# Altium footprint library Supernova Connectors.PcbLib: 303 footprints (part 12 of 19)
Each footprint in its own frame and in the unit in brackets; x right, y up, seen from the top. Pads: shape width x height; smd on the part's side, far side on the other; paste and mask are expansions set on the pad; w line width, h text height; cw(c..) or ccw(c..) is an arc to the next point about the centre after c.
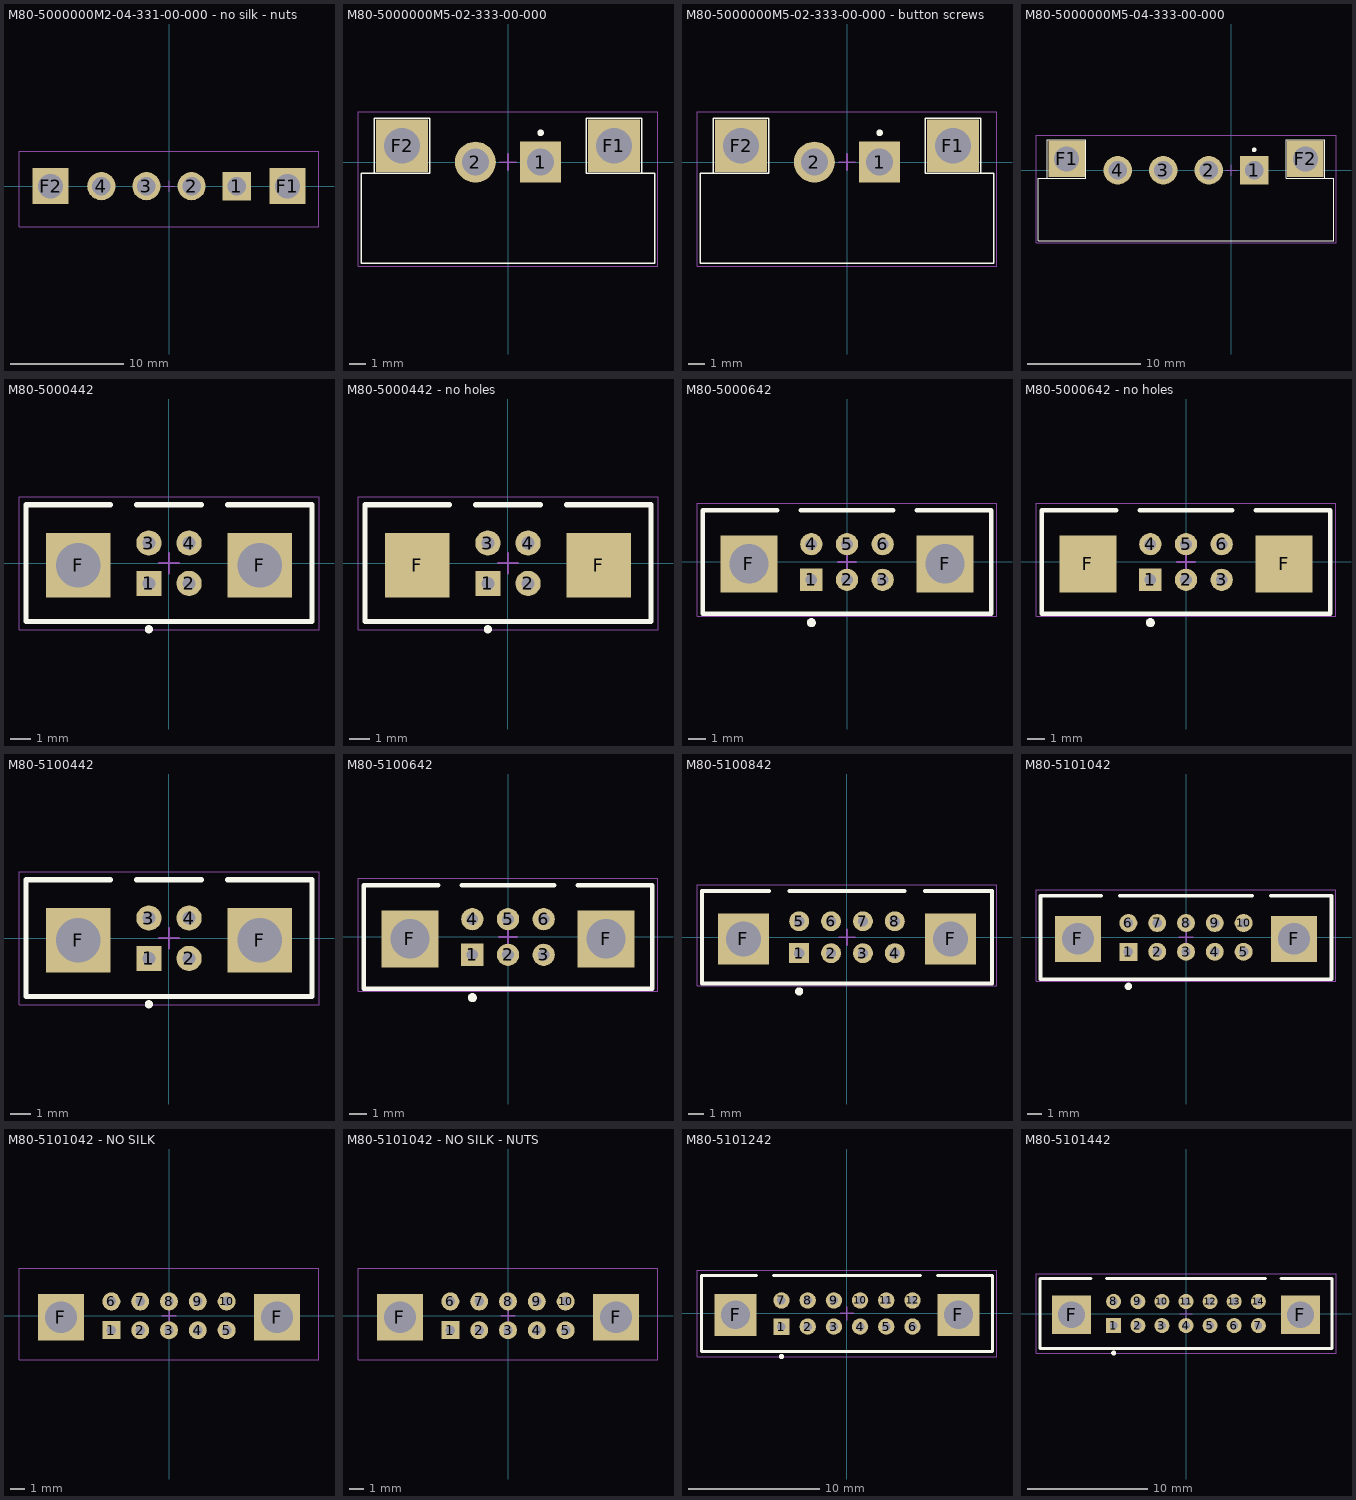
[diagram p11: the footprints below, top view; thin cyan lines are the x and y axes]

## M80-5000000M2-04-331-00-000 - no silk - nuts [mm]
pads (6):
  rect 2.5x2.5 hole 1.65: 1(6,0)
  round 2.5 hole 1.65: 2(2,0) 3(-2,0) 4(-6,0)
  rect 3.2x3.2 / inner round 4 / far side round 5 hole 2.2 paste+0 mask+0: F1(10.5,0) F2(-10.5,0)
Top Courtyard:
  lines w0.05: -13.3,-3.6 -13.3,3.1 13.3,3.1 13.3,-3.6 -13.3,-3.6
  lines w0.1: -0.5,0 0.5,0 ; 0,-0.5 0,0.5
3D body "m80-5000000m2-04-331-00-000_asm.STEP": height 6.29, standoff -2.81, extent -13,-3.275 13,2.775
3D body "94150A305_316 Stainless Steel Hex Nut.STEP": height 1.6, standoff 0, extent 8.5,-2.309 12.5,2.309
3D body "94150A305_316 Stainless Steel Hex Nut.STEP": height 1.6, standoff 0, extent -12.5,-2.309 -8.5,2.309

## M80-5000000M5-02-333-00-000 [mm]
pads (4):
  rect 2.5x2.5 hole 1.65: 1(2,0)
  round 2.5 hole 1.65: 2(-2,0)
  rect 3.2x3.2 / inner round 4 / far side round 4 hole 2.2 paste+0 mask+0: F1(6.5,1) F2(-6.5,1)
Top Overlay:
  circle w0.203: c2,1.795 r0.102
  lines w0.1: -8.207,-0.691 -8.207,2.687 -8.028,2.687 -4.803,2.687 -4.803,-0.691 -5.032,-0.691 -7.937,-0.691 -8.991,-0.691 -8.991,-6.2 8.991,-6.2 8.991,-0.691 7.937,-0.691 5.032,-0.691 4.803,-0.691 4.803,2.687 8.028,2.687 8.207,2.687 8.207,-0.691
Top Courtyard:
  lines w0.05: -9.2,-6.4 9.2,-6.4 9.2,3.1 -9.2,3.1 -9.2,-6.4
  lines w0.1: -0.5,0 0.5,0 ; 0,-0.5 0,0.5
3D body "m80-5000000m5-02-333-00-000_asm.stp": height 6.08, standoff -4.67, extent -9,-6.15 9,2.95

## M80-5000000M5-02-333-00-000 - button screws [mm]
pads (4):
  rect 2.5x2.5 hole 1.65: 1(2,0)
  round 2.5 hole 1.65: 2(-2,0)
  rect 3.2x3.2 / inner round 4 / far side round 4.5 hole 2.2 paste+0 mask+0: F1(6.5,1) F2(-6.5,1)
Top Overlay:
  circle w0.203: c2,1.795 r0.102
  lines w0.1: -8.207,-0.691 -8.207,2.687 -8.028,2.687 -4.803,2.687 -4.803,-0.691 -5.032,-0.691 -7.937,-0.691 -8.991,-0.691 -8.991,-6.2 8.991,-6.2 8.991,-0.691 7.937,-0.691 5.032,-0.691 4.803,-0.691 4.803,2.687 8.028,2.687 8.207,2.687 8.207,-0.691
Top Courtyard:
  lines w0.05: -9.2,-6.4 -9.2,3.1 9.2,3.1 9.2,-6.4 -9.2,-6.4
  lines w0.1: -0.5,0 0.5,0 ; 0,-0.5 0,0.5
3D body "m80-5000000m5-02-333-00-000_asm.stp.STEP": height 6.08, standoff -3.2, extent -9,-6.15 9,2.45
3D body "Screw, M2 Button.STEP": height 1.3, standoff -4, extent -8.5,-1 -4.5,3
3D body "Screw, M2 Button.STEP": height 1.3, standoff -4, extent 4.5,-1 8.5,3

## M80-5000000M5-04-333-00-000 [mm]
pads (6):
  rect 2.5x2.5 hole 1.65: 1(2,0)
  round 2.5 hole 1.65: 2(-2,0) 3(-6,0) 4(-10,0)
  rect 3.2x3.2 / inner round 4 / far side round 4 hole 2.2 paste+0 mask+0: F1(-14.5,1) F2(6.5,1)
Top Overlay:
  circle w0.203: c2,1.795 r0.102
  lines w0.1: -16.207,-0.691 -16.207,2.687 -16.028,2.687 -12.803,2.687 -12.803,-0.691 -13.032,-0.691 -15.937,-0.691 -16.991,-0.691 -16.991,-6.2 8.991,-6.2 8.991,-0.691 7.937,-0.691 5.032,-0.691 4.803,-0.691 4.803,2.687 8.028,2.687 8.207,2.687 8.207,-0.691
Top Courtyard:
  lines w0.05: -17.2,-6.4 9.2,-6.4 9.2,3.1 -17.2,3.1 -17.2,-6.4
  lines w0.1: -0.5,0 0.5,0 ; 0,-0.5 0,0.5
3D body "m80-5000000m5-04-333-00-000_asm.stp": height 6.08, standoff -3.45, extent -17,-6.15 9,2.95

## M80-5000442 [mm]
pads (6):
  rect 1.25x1.25 hole 0.65 paste+0: 1(-1,-1)
  round 1.25 hole 0.65 paste+0: 2(1,-1) 3(-1,1) 4(1,1)
  rect 3.2x3.2 / inner round 4 / far side round 4 hole 2.2 paste+0 mask+0: F(-4.5,-0.1) F(4.5,-0.1)
Top Overlay:
  circle w0.203: c-1,-3.278 r0.102
  lines w0.254: -2.9,2.9 -7.1,2.9 -7.1,-2.9 7.1,-2.9 7.1,2.9 2.9,2.9 ; -1.6,2.9 1.6,2.9
Top Courtyard:
  lines w0.05: -7.446,-3.302 7.446,-3.302 7.446,3.302 -7.446,3.302 -7.446,-3.302
  lines w0.1: -0.5,0 0.5,0 ; 0,-0.5 0,0.5
3D body "m80-5000442_asm.stp": height 5.65, standoff -3.2, extent -7,-2.775 7,3.275

## M80-5000442 - no holes [mm]
pads (6):
  rect 1.25x1.25 hole 0.65 paste+0: 1(-1,-1)
  round 1.25 hole 0.65 paste+0: 2(1,-1) 3(-1,1) 4(1,1)
  rect 3.2x3.2 smd paste+0 mask+0: F(-4.5,-0.1) F(4.5,-0.1)
Top Overlay:
  circle w0.203: c-1,-3.278 r0.102
  lines w0.254: -2.9,2.9 -7.1,2.9 -7.1,-2.9 7.1,-2.9 7.1,2.9 2.9,2.9 ; -1.6,2.9 1.6,2.9
Top Courtyard:
  lines w0.05: -7.446,-3.302 -7.446,3.302 7.446,3.302 7.446,-3.302 -7.446,-3.302
  lines w0.1: -0.5,0 0.5,0 ; 0,-0.5 0,0.5
3D body "m80-5000442_asm.stp": height 5.65, standoff -3.2, extent -7,-2.775 7,3.275

## M80-5000642 [mm]
pads (8):
  rect 1.25x1.25 hole 0.65 paste+0: 1(-2,-1)
  round 1.25 hole 0.65 paste+0: 2(0,-1) 3(2,-1) 4(-2,1) 5(0,1) 6(2,1)
  rect 3.2x3.2 / inner round 4 / far side round 4 hole 2.2 paste+0 mask+0: F(-5.5,-0.1) F(5.5,-0.1)
Top Overlay:
  circle w0.254: c-2,-3.4 r0.127
  lines w0.254: -3.9,2.9 -8.1,2.9 -8.1,-2.9 8.1,-2.9 8.1,2.9 3.9,2.9 ; -2.6,2.9 2.6,2.9
Top Courtyard:
  lines w0.05: -8.414,-3.048 8.414,-3.048 8.414,3.302 -8.414,3.302 -8.414,-3.048
  lines w0.1: -0.5,0 0.5,0 ; 0,-0.5 0,0.5
3D body "m80-5000642_asm.stp": height 5.65, standoff -3.2, extent -8,-2.775 8,3.275

## M80-5000642 - no holes [mm]
pads (8):
  rect 1.25x1.25 hole 0.65 paste+0: 1(-2,-1)
  round 1.25 hole 0.65 paste+0: 2(0,-1) 3(2,-1) 4(-2,1) 5(0,1) 6(2,1)
  rect 3.2x3.2 smd paste+0 mask+0: F(-5.5,-0.1) F(5.5,-0.1)
Top Overlay:
  circle w0.254: c-2,-3.4 r0.127
  lines w0.254: -3.9,2.9 -8.1,2.9 -8.1,-2.9 8.1,-2.9 8.1,2.9 3.9,2.9 ; -2.6,2.9 2.6,2.9
Top Courtyard:
  lines w0.05: -8.414,-3.048 8.414,-3.048 8.414,3.302 -8.414,3.302 -8.414,-3.048
  lines w0.1: -0.5,0 0.5,0 ; 0,-0.5 0,0.5
3D body "m80-5000642_asm.stp": height 5.65, standoff -3.2, extent -8,-2.775 8,3.275

## M80-5100442 [mm]
pads (6):
  rect 1.25x1.25 hole 0.65 paste+0: 1(-1,-1)
  round 1.25 hole 0.65 paste+0: 2(1,-1) 3(-1,1) 4(1,1)
  rect 3.2x3.2 / inner round 4 / far side round 4 hole 2.2 paste+0 mask+0: F(-4.5,-0.1) F(4.5,-0.1)
Top Overlay:
  circle w0.203: c-1,-3.278 r0.102
  lines w0.254: -2.9,2.9 -7.1,2.9 -7.1,-2.9 7.1,-2.9 7.1,2.9 2.9,2.9 ; -1.6,2.9 1.6,2.9
Top Courtyard:
  lines w0.05: -7.446,-3.302 -7.446,3.302 7.446,3.302 7.446,-3.302 -7.446,-3.302
  lines w0.1: -0.5,0 0.5,0 ; 0,-0.5 0,0.5
3D body "m80-5100442_asm.stp": height 5.65, standoff -4.55, extent -7,-2.775 7,3.275

## M80-5100642 [mm]
pads (8):
  rect 1.25x1.25 hole 0.65 paste+0: 1(-2,-1)
  round 1.25 hole 0.65 paste+0: 2(0,-1) 3(2,-1) 4(-2,1) 5(0,1) 6(2,1)
  rect 3.2x3.2 / inner round 4 / far side round 4 hole 2.2 paste+0 mask+0: F(-5.5,-0.1) F(5.5,-0.1)
Top Overlay:
  circle w0.254: c-2,-3.4 r0.127
  lines w0.254: -3.9,2.9 -8.1,2.9 -8.1,-2.9 8.1,-2.9 8.1,2.9 3.9,2.9 ; -2.6,2.9 2.6,2.9
Top Courtyard:
  lines w0.05: -8.414,-3.048 -8.414,3.302 8.414,3.302 8.414,-3.048 -8.414,-3.048
  lines w0.1: -0.5,0 0.5,0 ; 0,-0.5 0,0.5
3D body "m80-5100642_asm.stp": height 5.65, standoff -4.55, extent -8,-2.775 8,3.275

## M80-5100842 [mm]
pads (10):
  rect 1.25x1.25 hole 0.65 paste+0: 1(-3,-1)
  round 1.25 hole 0.65 paste+0: 2(-1,-1) 3(1,-1) 4(3,-1) 5(-3,1) 6(-1,1) 7(1,1) 8(3,1)
  rect 3.2x3.2 / inner round 4 / far side round 4 hole 2.2 paste+0 mask+0: F(-6.5,-0.1) F(6.5,-0.1)
Top Overlay:
  circle w0.254: c-3,-3.4 r0.127
  lines w0.254: -4.9,2.9 -9.1,2.9 -9.1,-2.9 9.089,-2.9 9.1,-2.889 9.1,2.9 4.9,2.9 ; -3.6,2.9 3.6,2.9
Top Courtyard:
  lines w0.05: -9.414,-3.048 9.414,-3.048 9.414,3.302 -9.414,3.302 -9.414,-3.048
  lines w0.1: -0.5,0 0.5,0 ; 0,-0.5 0,0.5
3D body "m80-5100842_asm.stp": height 5.65, standoff -4.55, extent -9,-2.775 9,3.275

## M80-5101042 [mm]
pads (12):
  rect 1.25x1.25 hole 0.65 paste+0: 1(-4,-1)
  round 1.25 hole 0.65 paste+0: 2(-2,-1) 3(0,-1) 4(2,-1) 5(4,-1) 6(-4,1) 7(-2,1) 8(0,1) 9(2,1) 10(4,1)
  rect 3.2x3.2 / inner round 4 / far side round 4 hole 2.2 paste+0 mask+0: F(-7.5,-0.1) F(7.5,-0.1)
Top Overlay:
  circle w0.254: c-4,-3.4 r0.127
  lines w0.254: -5.9,2.9 -10.1,2.9 -10.1,-2.9 10.1,-2.9 10.1,2.9 5.9,2.9 ; -4.6,2.9 0.075,2.9 ; -0.075,2.9 4.6,2.9
Top Courtyard:
  lines w0.05: -10.414,-3.048 -10.414,3.302 10.414,3.302 10.414,-3.048 -10.414,-3.048
  lines w0.1: -0.5,0 0.5,0 ; 0,-0.5 0,0.5
3D body "m80-5101042_asm.stp": height 5.64, standoff -4.56, extent -10,-2.775 10,3.275

## M80-5101042 - NO SILK [mm]
pads (12):
  rect 1.25x1.25 hole 0.65 paste+0: 1(-4,-1)
  round 1.25 hole 0.65 paste+0: 2(-2,-1) 3(0,-1) 4(2,-1) 5(4,-1) 6(-4,1) 7(-2,1) 8(0,1) 9(2,1) 10(4,1)
  rect 3.2x3.2 / inner round 4 / far side round 4 hole 2.2 paste+0 mask+0: F(-7.5,-0.1) F(7.5,-0.1)
Top Courtyard:
  lines w0.05: -10.414,-3.048 -10.414,3.302 10.414,3.302 10.414,-3.048 -10.414,-3.048
  lines w0.1: -0.5,0 0.5,0 ; 0,-0.5 0,0.5
3D body "m80-5101042_asm.stp": height 6.29, standoff -3.91, extent -10,-2.775 10,3.275

## M80-5101042 - NO SILK - NUTS [mm]
pads (12):
  rect 1.25x1.25 hole 0.65 paste+0: 1(-4,-1)
  round 1.25 hole 0.65 paste+0: 2(-2,-1) 3(0,-1) 4(2,-1) 5(4,-1) 6(-4,1) 7(-2,1) 8(0,1) 9(2,1) 10(4,1)
  rect 3.2x3.2 / inner round 4 / far side round 5 hole 2.2 paste+0 mask+0: F(-7.5,-0.1) F(7.5,-0.1)
Top Courtyard:
  lines w0.05: -10.414,-3.048 10.414,-3.048 10.414,3.302 -10.414,3.302 -10.414,-3.048
  lines w0.1: -0.5,0 0.5,0 ; 0,-0.5 0,0.5
3D body "m80-5101042_asm.stp.STEP": height 6.29, standoff -2.81, extent -10,-2.775 10,3.275
3D body "94150A305_316 Stainless Steel Hex Nut.STEP": height 1.6, standoff 0, extent 5.5,-2.409 9.5,2.209
3D body "94150A305_316 Stainless Steel Hex Nut.STEP": height 1.6, standoff 0, extent -9.5,-2.409 -5.5,2.209

## M80-5101242 [mm]
pads (14):
  rect 1.25x1.25 hole 0.65 paste+0: 1(-5,-1)
  round 1.25 hole 0.65 paste+0: 2(-3,-1) 3(-1,-1) 4(1,-1) 5(3,-1) 6(5,-1) 7(-5,1) 8(-3,1) 9(-1,1) 10(1,1) 11(3,1) 12(5,1)
  rect 3.2x3.2 / inner round 4 / far side round 4 hole 2.2 paste+0 mask+0: F(-8.5,-0.1) F(8.5,-0.1)
Top Overlay:
  circle w0.203: c-5,-3.278 r0.102
  lines w0.254: -6.9,2.9 -11.1,2.9 -11.1,-2.9 11.1,-2.9 11.1,2.9 6.9,2.9 ; -5.6,2.9 -0.925,2.9 5.6,2.9
Top Courtyard:
  lines w0.05: -11.446,-3.302 11.446,-3.302 11.446,3.302 -11.446,3.302 -11.446,-3.302
  lines w0.1: -0.5,0 0.5,0 ; 0,-0.5 0,0.5
3D body "m80-5101242_asm.stp": height 5.6, standoff -4.6, extent -11,-2.775 11,3.275

## M80-5101442 [mm]
pads (16):
  rect 1.25x1.25 hole 0.65 paste+0: 1(-6,-1)
  round 1.25 hole 0.65 paste+0: 2(-4,-1) 3(-2,-1) 4(0,-1) 5(2,-1) 6(4,-1) 7(6,-1) 8(-6,1) 9(-4,1) 10(-2,1) 11(0,1) 12(2,1) 13(4,1) 14(6,1)
  rect 3.2x3.2 / inner round 4 / far side round 4 hole 2.2 paste+0 mask+0: F(-9.5,-0.1) F(9.5,-0.1)
Top Overlay:
  circle w0.203: c-6,-3.278 r0.102
  lines w0.254: -7.9,2.9 -12.1,2.9 -12.1,-2.9 12.1,-2.9 12.1,2.9 7.9,2.9 ; -6.6,2.9 -1.925,2.9 6.6,2.9
Top Courtyard:
  lines w0.05: -12.446,-3.302 12.446,-3.302 12.446,3.302 -12.446,3.302 -12.446,-3.302
  lines w0.1: -0.5,0 0.5,0 ; 0,-0.5 0,0.5
3D body "m80-5101442_asm.stp": height 5.6, standoff -4.6, extent -12,-2.775 12,3.275